# Altium footprint library YS_PCBLIB.PcbLib: 133 footprints (part 9 of 9)
Each footprint in its own frame and in the unit in brackets; x right, y up, seen from the top. Pads: shape width x height; smd on the part's side, far side on the other; paste and mask are expansions set on the pad; w line width, h text height; cw(c..) or ccw(c..) is an arc to the next point about the centre after c.
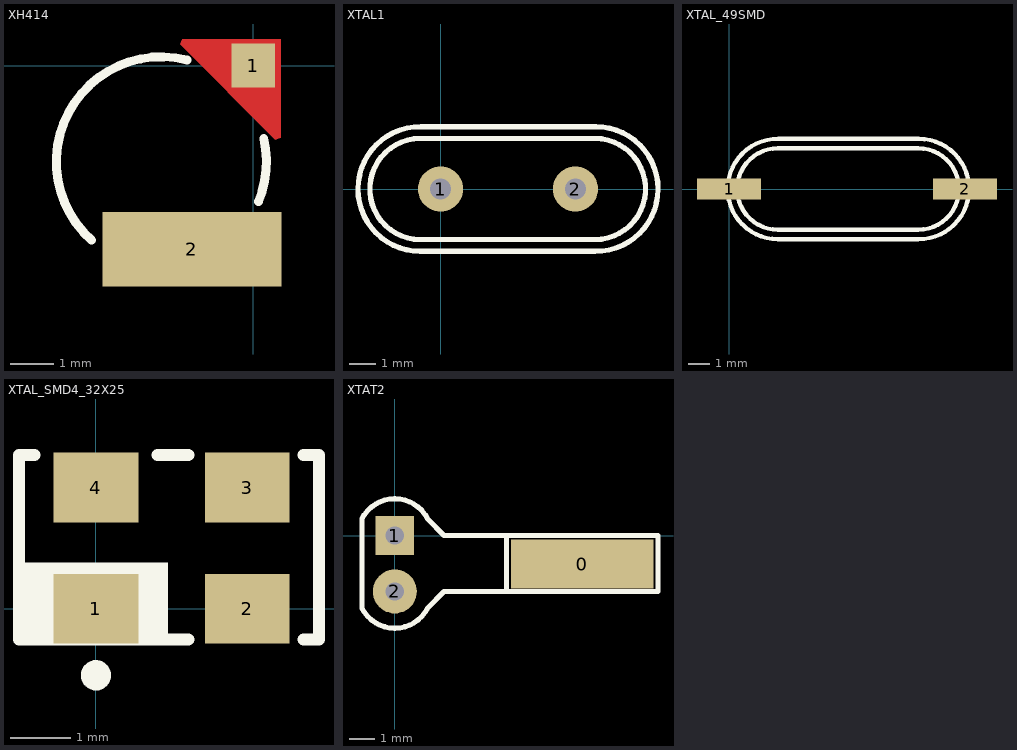
[diagram p8: the footprints below, top view; thin cyan lines are the x and y axes]

## XH414 [mm]
pads (2):
  rect 1x1 smd: 1(0,0)
  rect 4.1x1.7 smd: 2(-1.4,-4.2)
Top Layer:
  region: 0.624,-1.647 0.506,-1.696 -1.672,0.483 -1.624,0.6 0.624,0.6
Top Overlay:
  lines w0.203: -3.694,-3.994 cw(c-2.1,-2.2) -1.518,0.128 ; 0.121,-3.109 ccw(c-2.1,-2.2) 0.24,-1.668
Top Solder:
  region: 0.606,-1.641 0.489,-1.689 -1.689,0.489 -1.641,0.606 0.606,0.606

## XTAL1 [mm]
pads (2):
  round 1.7 hole 0.8: 1(0,0) 2(5.08,0)
Top Overlay:
  lines w0.2: -0.762,-2.35 cw(c-0.762,0) -0.737,2.35 5.842,2.35 cw(c5.842,0) 5.818,-2.35 -0.762,-2.35 ; -0.762,-1.905 cw(c-0.762,0) -0.762,1.905 5.817,1.905 cw(c5.817,0) 5.817,-1.905 -0.762,-1.905

## XTAL_49SMD [mm]
pads (2):
  rect 3x1 smd: 1(0,0) 2(11.049,0)
Top Overlay:
  lines w0.2: 2.286,-2.35 cw(c2.286,0) 2.311,2.35 8.89,2.35 cw(c8.89,0) 8.866,-2.35 2.286,-2.35 ; 2.286,-1.905 cw(c2.286,0) 2.286,1.905 8.865,1.905 cw(c8.865,0) 8.865,-1.905 2.286,-1.905

## XTAL_SMD4_32X25 [mm]
pads (4):
  rect 1.4x1.15 smd: 1(0,0) 2(2.5,0) 3(2.5,2) 4(0,2)
Top Overlay:
  circle w0.25: c0,-1.1 r0.125
  rectangle: -1.245,-0.61 1.194,0.762
  lines w0.2: -1.016,-0.508 -1.27,-0.508 -1.27,2.54 -1.016,2.54 ; 1.016,-0.508 1.524,-0.508 ; 1.016,2.54 1.524,2.54 ; 3.429,-0.508 3.683,-0.508 3.683,2.54 3.429,2.54

## XTAT2 [mm]
pads (3):
  rect 5.5x1.9 smd: 0(7.239,-1.1)
  rect 1.5x1.5 hole 0.7: 1(0,0)
  round 1.7 hole 0.7: 2(0,-2.159)
Top Overlay:
  lines w0.2: 4.318,-2.159 4.318,0 ; 7.493,-2.159 10.16,-2.159 10.16,0 8.255,0 1.905,0 1.27,0.635 ccw(c0,0) -1.27,0.635 -1.27,-2.794 ccw(c0,-2.159) 1.27,-2.794 1.905,-2.159 8.255,-2.159